# Altium footprint library tsl_Pcblib.PcbLib: 219 footprints (part 8 of 14)
Each footprint in its own frame and in the unit in brackets; x right, y up, seen from the top. Pads: shape width x height; smd on the part's side, far side on the other; paste and mask are expansions set on the pad; w line width, h text height; cw(c..) or ccw(c..) is an arc to the next point about the centre after c.
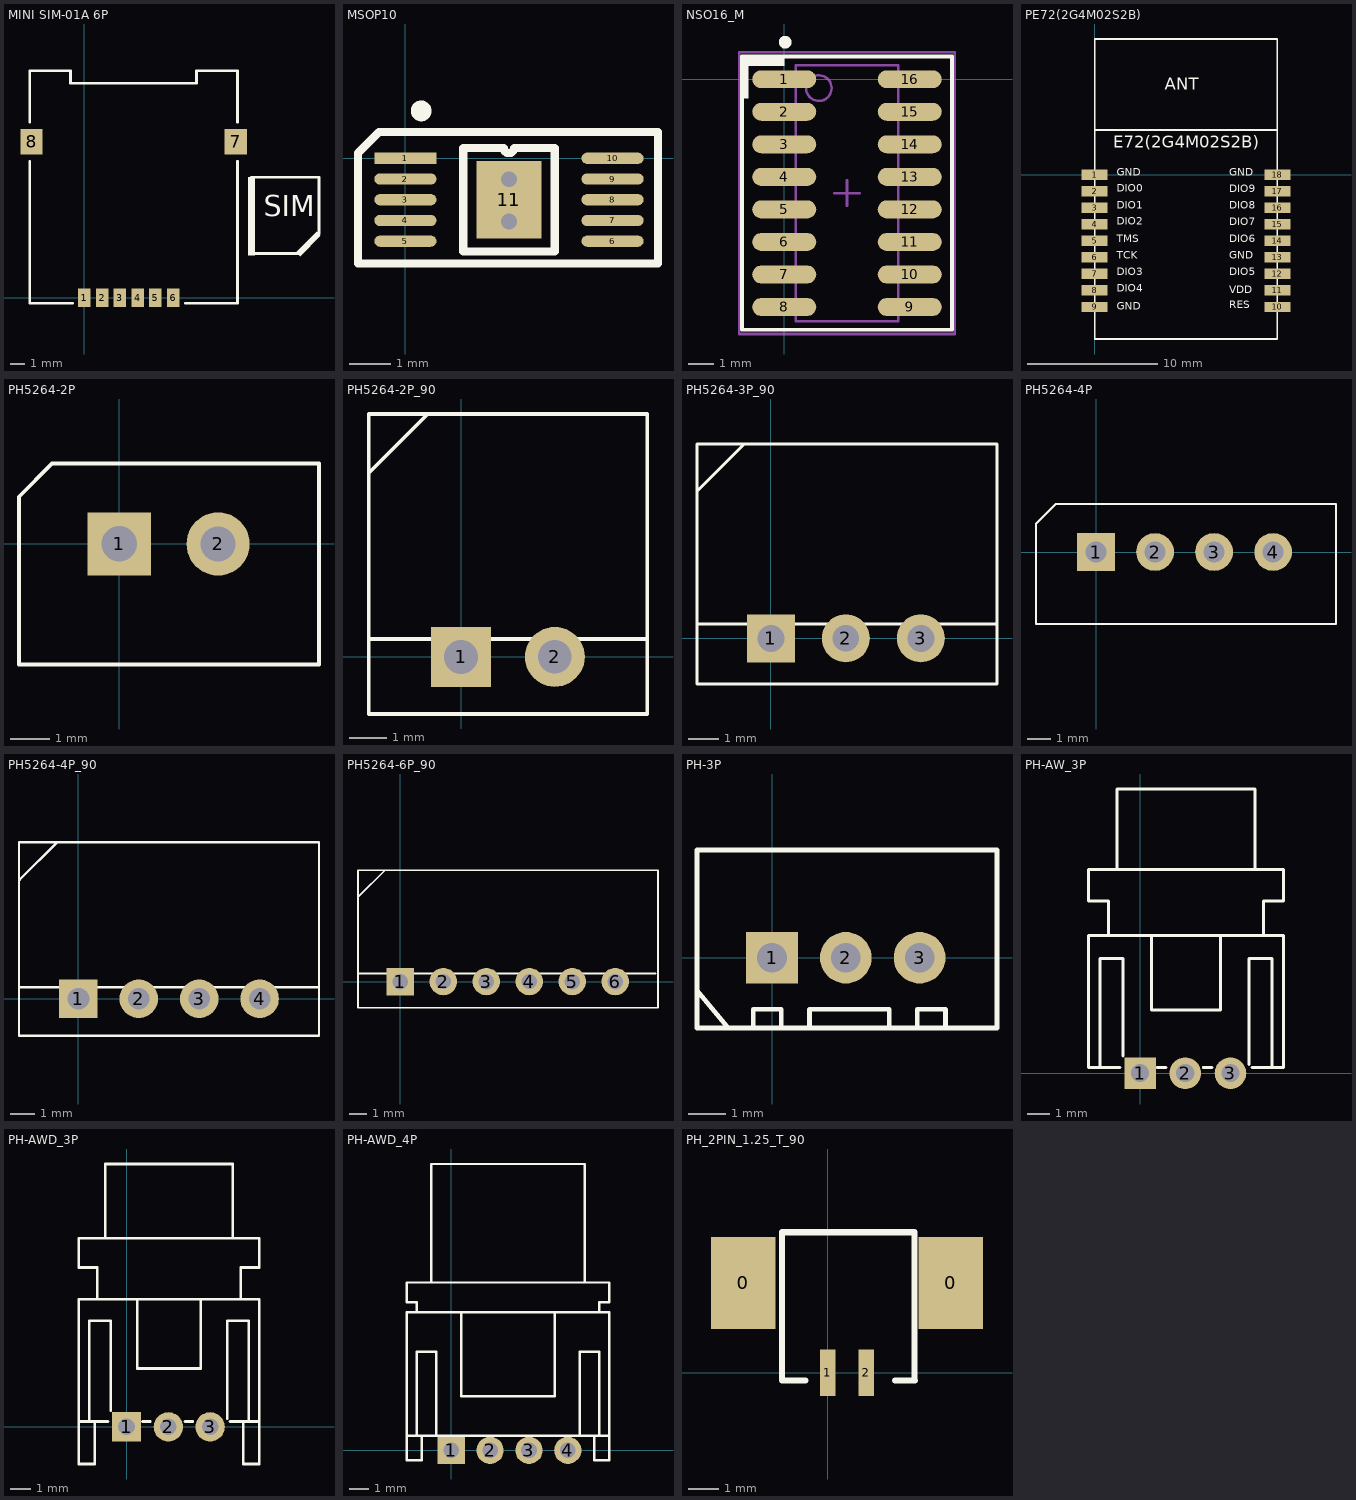
[diagram p7: the footprints below, top view; thin cyan lines are the x and y axes]

## MINI SIM-01A 6P [mm] "自弹MICROSIM卡座 SIM-002-6P"
pads (8):
  rect 0.9x1.34 smd: 1(0,0) 2(1.27,0) 3(2.54,0) 4(3.81,0) 5(5.08,0) 6(6.35,0)
  rect 1.6x1.8 smd: 7(10.825,11.176) 8(-3.78,11.176)
Top Overlay:
  rectangle: 11.714,3.048 12.222,8.636
  region: 16.921,4.445 16.625,4.741 15.15,3.266 15.446,2.97
  lines w0.2: 11.968,3.175 15.397,3.175 ; 11.968,8.636 16.794,8.636 16.794,4.572
  lines w0.203: -3.907,9.779 -3.907,-0.381 -0.859,-0.381 ; -3.907,12.573 -3.907,16.256 -0.986,16.256 -0.986,15.367 8.031,15.367 8.031,16.256 10.952,16.256 10.952,12.573 ; -2.447,16.256 -2.129,16.256 ; 7.237,-0.381 10.952,-0.381 10.952,9.779
  text "SIM" at 12.857,5.334 h2.54

## MSOP10 [mm]
pads (11):
  rect 1.5x0.27 smd: 1(0,0)
  oval 1.5x0.27 smd: 2(0,-0.5) 3(0,-1) 4(0,-1.5) 5(0,-2) 6(5,-2) 7(5,-1.5) 8(5,-1) 9(5,-0.5) 10(5,0)
  rect 1.57x1.88 smd: 11(2.5,-1)
via 2.5,-0.508 diameter 0.762 hole 0.381
via 2.5,-1.524 diameter 0.762 hole 0.381
Top Overlay:
  circle w0.25: c0.381,1.143 r0.125
  lines w0.2: -1.143,-2.54 6.096,-2.54 6.096,0.635 -0.635,0.635 -1.143,0.127 -1.143,-2.54 ; 1.395,-2.25 1.395,0.25 2.375,0.25 ccw(c2.5,0.25) 2.625,0.25 3.605,0.25 3.605,-2.25 1.395,-2.25
3D body "User Library-DGQ (S-PDSO-G10).STEP": height 1.1, standoff 0, extent -0.018,-2.55 5.018,0.55

## NSO16_M [mm]
height 1.75
pads (16):
  oval 2.5x0.7 smd: 1(0,0) 2(0,-1.27) 3(0,-2.54) 4(0,-3.81) 5(0,-5.08) 6(0,-6.35) 7(0,-7.62) 8(0,-8.89) 9(4.9,-8.89) 10(4.9,-7.62) 11(4.9,-6.35) 12(4.9,-5.08) 13(4.9,-3.81) 14(4.9,-2.54) 15(4.9,-1.27) 16(4.9,0)
Top Overlay:
  circle w0.25: c0.039,1.448 r0.125
  rectangle: -1.649,-0.756 -1.396,0.895
  rectangle: -1.649,0.514 0.001,0.895
  lines w0.152: -1.65,-9.779 6.55,-9.779 6.55,0.889 -1.65,0.889 -1.65,-9.779
Mechanical 13:
  circle w0.1: c1.35,-0.345 r0.5
  lines w0.1: 0.45,-9.445 0.45,0.555 4.45,0.555 4.45,-9.445 0.45,-9.445
Mechanical 15:
  lines w0.1: 1.95,-4.445 2.95,-4.445 ; 2.45,-4.945 2.45,-3.945 ; -1.75,-9.945 -1.75,1.055 6.65,1.055 6.65,-9.945 -1.75,-9.945

## PCBComponent_1 [mm]

## PE72(2G4M02S2B) [mm] "24mm*13mm*1.8mm-S"
pads (18):
  rect 2x0.8 smd: 1(0,0) 2(0,-1.27) 3(0,-2.54) 4(0,-3.81) 5(0,-5.08) 6(0,-6.35) 7(0,-7.62) 8(0,-8.89) 9(0,-10.16) 10(14.005,-10.16) 11(14.005,-8.89) 12(14.005,-7.62) 13(14.005,-6.35) 14(14.005,-5.08) 15(14.005,-3.81) 16(14.005,-2.54) 17(14.005,-1.27) 18(14.005,0)
Top Overlay:
  lines w0.127: 0.004,3.412 14.006,3.412 ; 0.004,-12.615 14.006,-12.615 14.006,10.397 0.004,10.397 0.004,-12.615
  text "ANT" at 5.37,6.188 h1.6
  text "E72(2G4M02S2B)" at 1.433,1.743 h1.6
  text "GND" at 1.687,-0.289 h1
  text "DIO0" at 1.679,-1.517 h1
  text "DIO1" at 1.687,-2.829 h1
  text "DIO2" at 1.679,-4.052 h1
  text "TMS" at 1.687,-5.369 h1
  text "TCK" at 1.687,-6.639 h1
  text "DIO3" at 1.687,-7.909 h1
  text "DIO4" at 1.687,-9.179 h1
  text "GND" at 1.687,-10.576 h1
  text "RES" at 10.323,-10.449 h1
  text "VDD" at 10.323,-9.306 h1
  text "DIO5" at 10.323,-7.909 h1
  text "GND" at 10.323,-6.639 h1
  text "DIO6" at 10.323,-5.369 h1
  text "DIO7" at 10.323,-4.099 h1
  text "DIO8" at 10.323,-2.829 h1
  text "DIO9" at 10.323,-1.559 h1
  text "GND" at 10.323,-0.289 h1

## PH5264-2P [mm]
pads (2):
  rect 1.6x1.6 hole 0.9: 1(0,0)
  round 1.6 hole 0.89: 2(2.5,0)
Top Overlay:
  lines w0.1: -2.54,-3.048 5.055,-3.048 5.055,2.032 -1.702,2.032 -2.54,1.194 -2.54,-3.048

## PH5264-2P_90 [mm]
pads (2):
  rect 1.6x1.6 hole 0.9: 1(0,0)
  round 1.6 hole 0.89: 2(2.5,0)
Top Overlay:
  lines w0.1: -2.46,0.477 4.96,0.477 ; -2.46,6.477 -2.46,-1.523 4.96,-1.523 4.96,6.477 ; -2.437,4.929 -0.889,6.477
  lines w0.102: -2.46,6.477 4.96,6.477
3D body: height 5, standoff 0, extent -2.391,-1.523 4.96,6.503

## PH5264-3P_90 [mm]
pads (3):
  rect 1.6x1.6 hole 0.9: 1(0,0)
  round 1.6 hole 0.89: 2(2.5,0)
  round 1.6 hole 0.9: 3(5,0)
Top Overlay:
  lines w0.1: -2.46,0.477 7.54,0.477 ; -2.437,4.929 -0.889,6.477 ; 7.54,4.445 7.54,4.477 ; -2.46,-1.523 -2.46,6.477 7.54,6.477 7.54,-1.523 -2.46,-1.523
3D body: height 5, standoff 0, extent -2.391,-1.523 7.54,6.503

## PH5264-4P [mm]
pads (4):
  rect 1.6x1.6 hole 0.9: 1(0,0)
  round 1.6 hole 0.89: 2(2.5,0) 4(7.5,0)
  round 1.6 hole 0.9: 3(5,0)
Top Overlay:
  lines w0.1: -2.54,-3.048 -2.54,1.194 -1.702,2.032 10.16,2.032 10.16,-3.048 -2.54,-3.048
3D body: height 6, standoff 0, extent -2.54,-2.997 10.185,1.93

## PH5264-4P_90 [mm]
pads (4):
  rect 1.6x1.6 hole 0.9: 1(0,0)
  round 1.6 hole 0.89: 2(2.5,0) 4(7.5,0)
  round 1.6 hole 0.9: 3(5,0)
Top Overlay:
  lines w0.1: -2.46,0.477 9.96,0.477 ; -2.437,4.929 -0.889,6.477 ; -2.46,-1.523 -2.46,6.477 9.96,6.477 9.96,-1.523 -2.46,-1.523
3D body: height 5, standoff 0, extent -2.391,-1.523 9.96,6.503

## PH5264-6P_90 [mm]
pads (6):
  rect 1.6x1.6 hole 0.9: 1(0,0)
  round 1.6 hole 0.89: 2(2.5,0) 4(7.5,0)
  round 1.6 hole 0.9: 3(5,0) 5(10,0) 6(12.5,0)
Top Overlay:
  lines w0.1: -2.46,0.477 14.859,0.477 ; -2.437,4.929 -0.889,6.477 ; -2.46,-1.523 -2.46,6.477 14.986,6.477 14.986,-1.523 -2.46,-1.523
3D body: height 5, standoff 0, extent -2.391,-1.523 14.986,6.503

## PH-3P [mm]
pads (3):
  rect 1.4x1.4 hole 0.8: 1(0,0)
  round 1.4 hole 0.8: 2(2,0) 3(4,0)
Top Overlay:
  lines w0.127: -2.032,-0.889 -1.22,-1.863 ; -0.508,-1.905 -0.508,-1.397 0.254,-1.397 0.254,-1.905 ; 1.016,-1.905 1.016,-1.397 3.175,-1.397 3.175,-1.905 ; 3.937,-1.905 3.937,-1.397 4.699,-1.397 4.699,-1.905 ; -2.032,-1.905 6.096,-1.905 6.096,2.921 -2.032,2.921 -2.032,-1.905

## PH-AW_3P [mm]
pads (3):
  rect 1.4x1.4 hole 0.8: 1(0,0)
  round 1.4 hole 0.8: 2(2,0) 3(4,0)
Top Overlay:
  lines w0.127: -1.778,0.254 -1.778,5.08 -0.762,5.08 -0.762,0.762 ; -1.397,6.096 -1.397,7.62 -2.286,7.62 -2.286,9.017 5.461,9.017 6.35,9.017 6.35,7.62 5.461,7.62 5.461,6.096 ; -1.016,9.017 -1.016,12.573 5.08,12.573 5.08,9.017 ; -0.889,0.254 -2.286,0.254 -2.286,6.096 6.35,6.096 6.35,0.254 4.953,0.254 ; 0.508,6.096 0.508,2.794 3.556,2.794 3.556,6.096 ; 0.762,0.254 1.143,0.254 ; 2.794,0.254 3.175,0.254 ; 4.826,0.381 4.826,5.08 5.842,5.08 5.842,0.254

## PH-AWD_3P [mm]
pads (3):
  rect 1.4x1.4 hole 0.8: 1(0,0)
  round 1.4 hole 0.8: 2(2,0) 3(4,0)
Top Overlay:
  lines w0.127: -1.778,0.254 -1.778,5.08 -0.762,5.08 -0.762,0.762 ; -1.524,0.254 -1.524,-1.778 -1.778,-1.778 -2.286,-1.778 -2.286,0.254 ; -1.397,6.096 -1.397,7.62 -2.286,7.62 -2.286,9.017 5.461,9.017 6.35,9.017 6.35,7.62 5.461,7.62 5.461,6.096 ; -1.016,9.017 -1.016,12.573 5.08,12.573 5.08,9.017 ; -0.889,0.254 -2.286,0.254 ; 0.508,6.096 0.508,2.794 3.556,2.794 3.556,6.096 ; 0.762,0.254 1.143,0.254 ; 2.794,0.254 3.175,0.254 ; 4.826,0.381 4.826,5.08 5.842,5.08 5.842,0.254 ; 4.953,0.254 6.35,0.254 ; 5.588,0.254 5.588,-1.778 5.842,-1.778 6.35,-1.778 6.35,0.254 ; -2.286,0.254 -2.286,6.096 6.35,6.096 6.35,0.254

## PH-AWD_4P [mm]
pads (4):
  rect 1.4x1.4 hole 0.8: 1(0,0)
  round 1.4 hole 0.8: 2(2,0) 3(4,0) 4(6,0)
Top Overlay:
  lines w0.127: -2.286,0.762 8.128,0.762 ; -1.778,0.762 -1.778,5.08 -0.762,5.08 -0.762,0.762 ; -1.778,7.112 -1.778,7.62 -2.286,7.62 -2.286,8.636 -1.778,8.636 7.62,8.636 8.128,8.636 8.128,7.62 7.62,7.62 7.62,7.112 ; -1.524,0.762 -1.524,-0.508 -2.286,-0.508 -2.286,7.112 8.128,7.112 8.128,-0.508 7.366,-0.508 7.366,0.762 ; -1.016,8.636 -1.016,14.732 6.858,14.732 6.858,8.636 ; 0.508,7.112 0.508,2.794 5.334,2.794 5.334,7.112 ; 6.604,0.762 6.604,5.08 7.62,5.08 7.62,0.762

## PH_2PIN_1.25_T_90 [mm]
pads (4):
  rect 2.1x3 smd: 0(-2.757,2.921) 0(4.007,2.921)
  rect 0.5x1.5 smd: 1(0,0) 2(1.25,0)
Top Overlay:
  lines w0.2: -0.725,-0.254 -1.487,-0.254 -1.487,4.572 2.794,4.572 ; 2.196,-0.254 2.831,-0.254 ; 2.817,-0.254 2.817,4.572